# Altium footprint library PCBLIB.PcbLib: 775 footprints (part 20 of 49)
Each footprint in its own frame and in the unit in brackets; x right, y up, seen from the top. Pads: shape width x height; smd on the part's side, far side on the other; paste and mask are expansions set on the pad; w line width, h text height; cw(c..) or ccw(c..) is an arc to the next point about the centre after c.
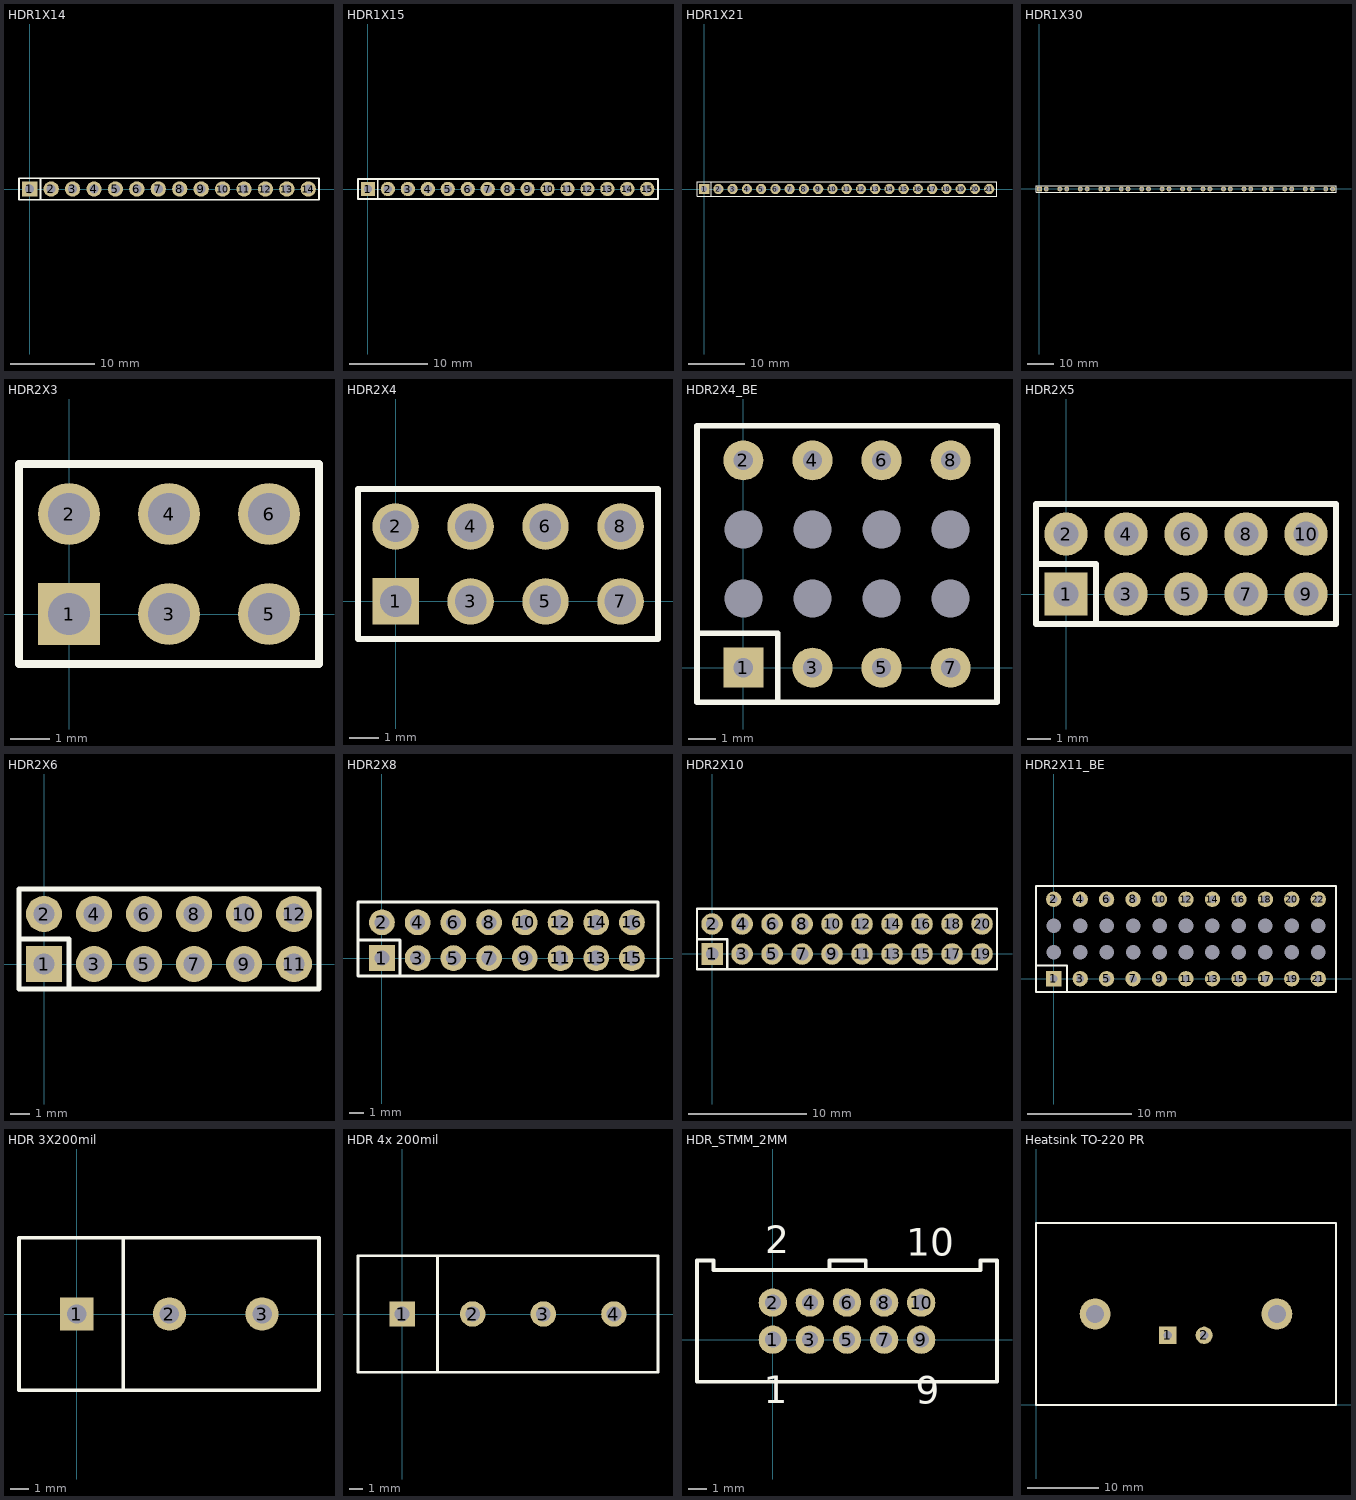
[diagram p19: the footprints below, top view; thin cyan lines are the x and y axes]

## HDR1X14 [mil]
height 390
pads (14):
  rect 72x72 hole 42: 1(0,0)
  round 72 hole 42: 2(100,0) 3(200,0) 4(300,0) 5(400,0) 6(500,0) 7(600,0) 8(700,0) 9(800,0) 10(900,0) 11(1000,0) 12(1100,0) 13(1200,0) 14(1300,0)
TopOverlay:
  lines w8: 50,-50 50,50 ; -50,-50 1350,-50 1350,50 -50,50 -50,-50
Mechanical4:
  text ".341" at 0,0 h1

## HDR1X15 [mil]
pads (15):
  rect 72x72 hole 42: 1(0,0)
  round 72 hole 42: 2(100,0) 3(200,0) 4(300,0) 5(400,0) 6(500,0) 7(600,0) 8(700,0) 9(800,0) 10(900,0) 11(1000,0) 12(1100,0) 13(1200,0) 14(1300,0) 15(1400,0)
TopOverlay:
  lines w8: 50,-50 50,50 ; -50,-50 1453.66,-50 1453.66,50 -50,50 -50,-50
Mechanical4:
  text ".341" at 0,0 h1

## HDR1X21 [mil]
pads (21):
  rect 72x72 hole 42: 1(0,0)
  round 72 hole 42: 2(100,0) 3(200,0) 4(300,0) 5(400,0) 6(500,0) 7(600,0) 8(700,0) 9(800,0) 10(900,0) 11(1000,0) 12(1100,0) 13(1200,0) 14(1300,0) 15(1400,0) 16(1500,0) 17(1600,0) 18(1700,0) 19(1800,0) 20(1900,0) 21(2000,0)
TopOverlay:
  lines w8: 50,-50 50,50 ; -50,-50 2054.56,-50 2054.56,50 -50,50 -50,-50
Mechanical4:
  text ".341" at 0,0 h1

## HDR1X30 [mil]
pads (30):
  rect 72x72 hole 42: 1(0,0)
  round 72 hole 42: 2(100,0) 3(300,0) 4(400,0) 5(600,0) 6(700,0) 7(900,0) 8(1000,0) 9(1200,0) 10(1300,0) 11(1500,0) 12(1600,0) 13(1800,0) 14(1900,0) 15(2100,0) 16(2200,0) 17(2400,0) 18(2500,0) 19(2700,0) 20(2800.25,0) 21(3000,0) 22(3100,0) 23(3300,0) 24(3400,0) 25(3600,0) 26(3700,0) 27(3900,0) 28(4000,0) 29(4200,0) 30(4300,0)
TopOverlay:
  lines w8: -50.25,-50.23 -50.25,49.77 ; -50,-50 4350,-50 4350,50 -50,50
Mechanical4:
  text ".341" at 0,0 h1

## HDR2X3 [mil]
pads (6):
  rect 62x62 hole 42: 1(0,0)
  round 62 hole 42: 2(0,100) 3(100,0) 4(100,100) 5(200,0) 6(200,100)
TopOverlay:
  lines w8: 58.33,-50 250,-50 ; 250,-50 250,150 -50,150 -50,-50 250,-50
Mechanical4:
  text ".341" at 0,0 h1
  text ".341" at -0.27,0 h1

## HDR2X4 [mil]
pads (8):
  rect 62x62 hole 42: 1(0,0)
  round 62 hole 42: 2(0,100) 3(100,0) 4(100,100) 5(200,0) 6(200,100) 7(300,0) 8(300,100)
TopOverlay:
  lines w8: -50,-50 350,-50 350,150 -50,150 -50,-50
Mechanical4:
  text ".341" at -0.27,0 h1
  text ".341" at 0,0 h1

## HDR2X4_BE [mil]
height 100
pads (16):
  round 1 hole 55 unplated: 0(0,100) 0(0,200) 0(100,100) 0(100,200) 0(200,100) 0(200,200) 0(300,100) 0(300,200)
  rect 58x58 hole 28: 1(0,0)
  round 58 hole 28: 2(0,300) 3(100,0) 4(100,300) 5(200,0) 6(200,300) 7(300,0) 8(300,300)
TopOverlay:
  lines w8: -67,50 50,50 50,-50 ; -67,-50 367,-50 367,350 -67,350 -67,-50

## HDR2X5 [mil]
pads (10):
  rect 72x72 hole 42: 1(0,0)
  round 72 hole 42: 2(0,100) 3(100,0) 4(100,100) 5(200,0) 6(200,100) 7(300,0) 8(300,100) 9(400,0) 10(400,100)
TopOverlay:
  lines w10: -50,50 50,50 50,-48 ; 58.33,-50 250,-50 ; 250,-50 -50,-50 -50,150 250,150 450,150 450,-50 250,-50
Mechanical4:
  text ".341" at -0.27,0 h1
  text ".341" at 0,0 h1

## HDR2X6 [mil]
pads (12):
  rect 72x72 hole 42: 1(0,0)
  round 72 hole 42: 2(0,100) 3(100,0) 4(100,100) 5(200,0) 6(200,100) 7(300,0) 8(300,100) 9(400,0) 10(400,100) 11(500,0) 12(500,100)
TopOverlay:
  lines w10: -50,50 50,50 50,-48 ; 58.33,-50 250,-50 ; 450,150 550,150 ; 250,-50 450,-50 550,-50 550,150 ; 250,-50 -50,-50 -50,150 250,150 550,150
Mechanical4:
  text ".341" at 0,0 h1
  text ".341" at -0.27,0 h1

## HDR2X8 [mil]
pads (16):
  rect 72x72 hole 42: 1(0,0)
  round 72 hole 42: 2(0,100) 3(100,0) 4(100,100) 5(200,0) 6(200,100) 7(300,0) 8(300,100) 9(400,0) 10(400,100) 11(500,0) 12(500,100) 13(600,0) 14(600,100) 15(700,0) 16(700,100)
TopOverlay:
  lines w8: -67,51.1 51,51.1 51,-48.9 ; -67,-50 773,-50 773,157 -67,157 -67,-50

## HDR2X10 [mil]
pads (20):
  rect 72x72 hole 42: 1(0,0)
  round 72 hole 42: 2(0,100) 3(100,0) 4(100,100) 5(200,0) 6(200,100) 7(300,0) 8(300,100) 9(400,0) 10(400,100) 11(500,0) 12(500,100) 13(600,0) 14(600,100) 15(700,0) 16(700,100) 17(800,0) 18(800,100) 19(900,0) 20(900,100)
TopOverlay:
  lines w8: -49.61,49.77 50,49.77 50,-50.23 ; -50.25,-50.23 -50.25,150.21 125.19,150.21 950,150.21 950,-50.23 -50.25,-50.23
Mechanical4:
  text ".341" at 0,0 h1

## HDR2X11_BE [mil]
height 100
pads (44):
  round 1 hole 55 unplated: 0(0,100) 0(0,200) 0(100,100) 0(100,200) 0(200,100) 0(200,200) 0(300,100) 0(300,200) 0(400,100) 0(400,200) 0(500,100) 0(500,200) 0(600,100) 0(600,200) 0(700,100) 0(700,200) 0(800,100) 0(800,200) 0(900,100) 0(900,200) 0(1000,100) 0(1000,200)
  rect 58x58 hole 28: 1(0,0)
  round 58 hole 28: 2(0,300) 3(100,0) 4(100,300) 5(200,0) 6(200,300) 7(300,0) 8(300,300) 9(400,0) 10(400,300) 11(500,0) 12(500,300) 13(600,0) 14(600,300) 15(700,0) 16(700,300) 17(800,0) 18(800,300) 19(900,0) 20(900,300) 21(1000,0) 22(1000,300)
TopOverlay:
  lines w8: -67,50 50,50 50,-50 ; -67,-50 -67,350 1067,350 1067,-50 -67,-50

## HDR 3X200mil [mil]
pads (3):
  rect 72x72 hole 42: 1(0,0)
  round 72 hole 42: 2(200,0) 3(400,0)
TopOverlay:
  lines w8: 100,-165 100,165 ; -125,-165 -125,165 350,165 523,165 523,-165 350,-165 -125,-165
Mechanical4:
  text ".341" at 0,-0.23 h1
  text ".341" at 0,0 h1

## HDR 4x 200mil [mil]
height 390
pads (4):
  rect 72x72 hole 42: 1(0,0)
  round 72 hole 42: 2(200,0) 3(400,0) 4(600,0)
TopOverlay:
  lines w8: 100,-165 100,165 ; -125,-165 350,-165 725,-165 725,165 350,165 -125,165 -125,-165
Mechanical4:
  text ".341" at 0,0 h1
  text ".341" at 0,-0.23 h1

## HDR_STMM_2MM [mil]
height 205
pads (10):
  round 60 hole 34: 1(0,0) 2(0,78.74) 3(78.74,0) 4(78.74,78.74) 5(157.48,0) 6(157.48,78.74) 7(236.22,0) 8(236.22,78.74) 9(314.96,0) 10(314.96,78.74)
TopOverlay:
  lines w8: 121.3,147.87 120.42,148.75 120.42,167.87 135.26,167.87 157.47,167.87 177.78,167.87 197.06,167.87 197.06,148.26 197.46,147.87 ; 475.73,167.63 475.73,-89.13 -160.77,-89.13 -160.77,167.87 -125.77,167.87 -125.77,147.87 440.73,147.87 440.73,167.87 475.73,167.87
  text "1" at -18.96,-154.14 h100
  text "9" at 303.44,-155.41 h100
  text "2" at -16.42,164.46 h100
  text "10" at 283.13,159.38 h100

## Heatsink TO-220 PR [mil]
pads (4):
  rect 95x95 hole 45: 1(725,383)
  round 95 hole 45: 2(925,383)
  round 170 hole 100: ""(325,500) ""(1325,500)
TopOverlay:
  lines w10: 0,0 1650,0 1650,1000 0,1000 0,0